# Altium footprint library Key & Switch's.PcbLib: 58 footprints (part 1 of 4)
Each footprint in its own frame and in the unit in brackets; x right, y up, seen from the top. Pads: shape width x height; smd on the part's side, far side on the other; paste and mask are expansions set on the pad; w line width, h text height; cw(c..) or ccw(c..) is an arc to the next point about the centre after c.
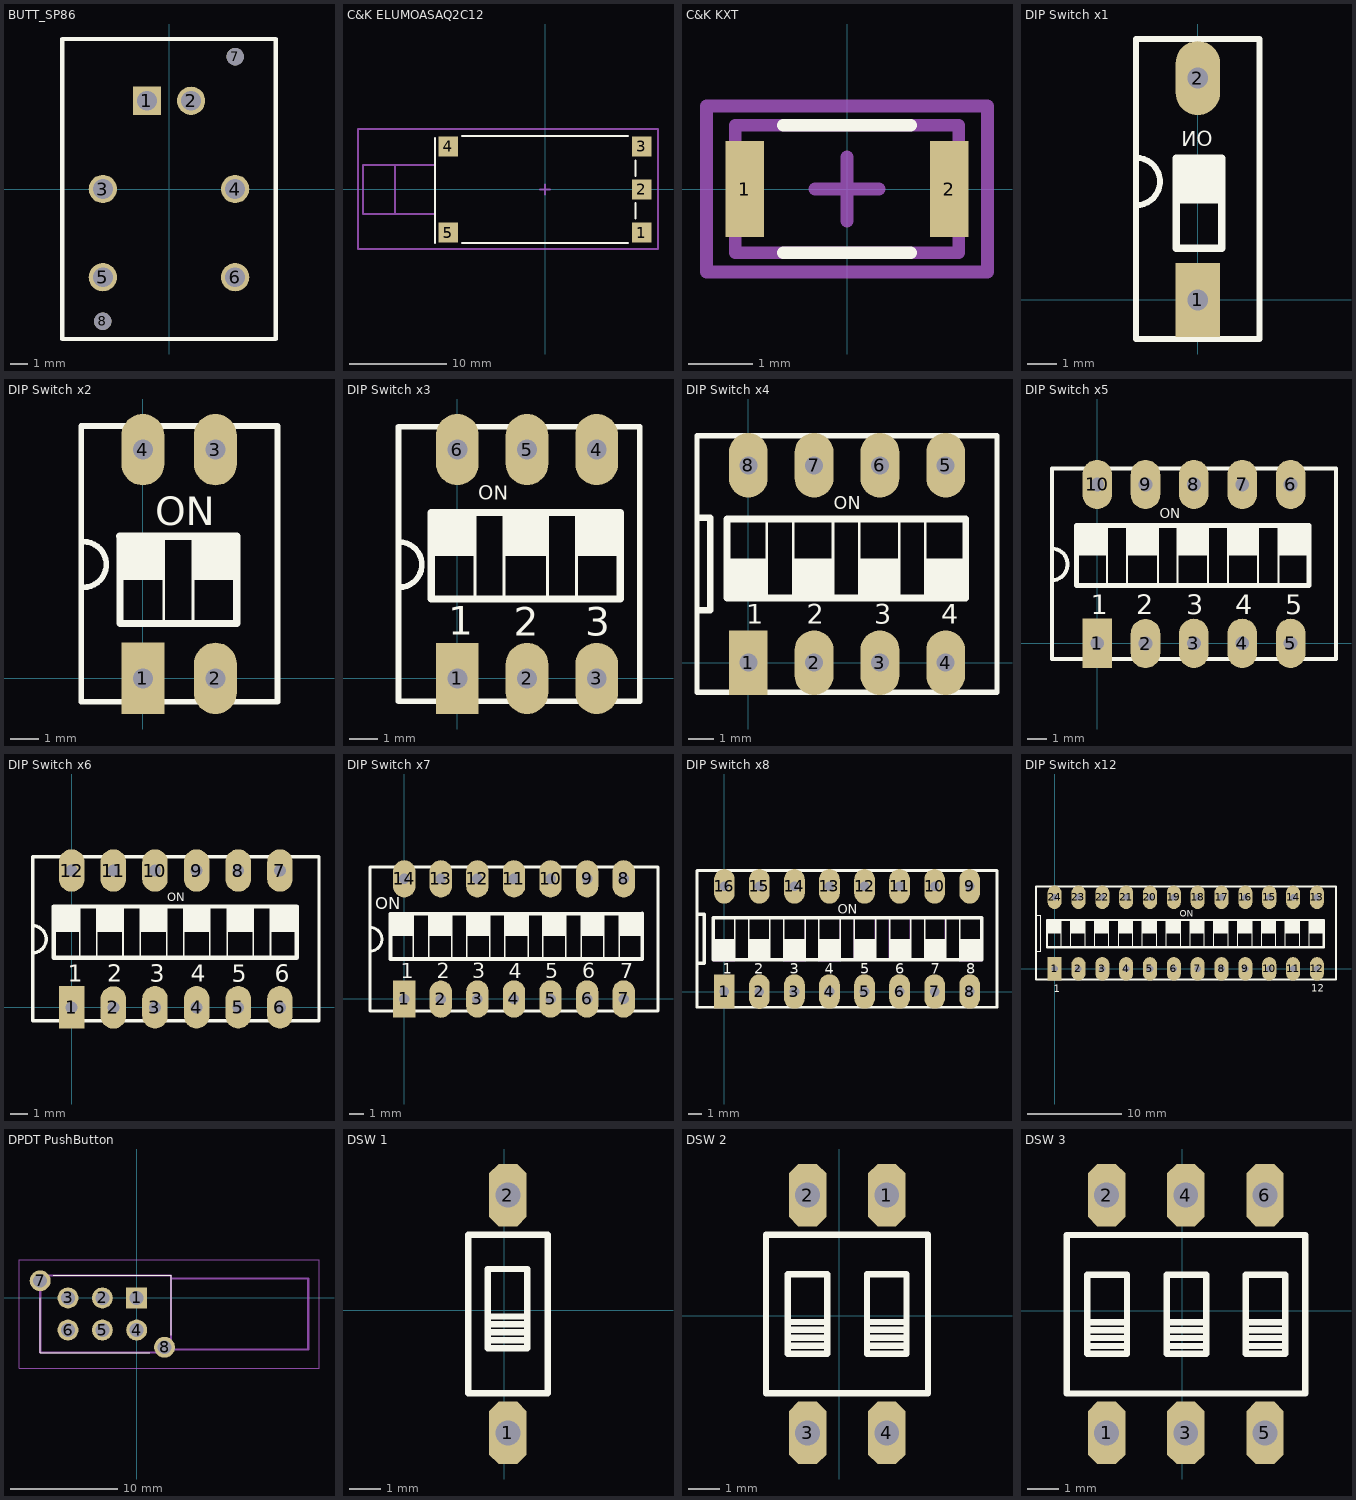
[diagram p0: the footprints below, top view; thin cyan lines are the x and y axes]

## BUTT_SP86 [mil]
pads (8):
  rect 64x64 hole 45: 1(-50,200)
  round 64 hole 45: 2(50,200) 3(-150,0) 4(150,0) 5(-150,-200) 6(150,-200)
  round 39.37 hole 39.37 unplated: 7(150,300) 8(-150.09,-299.86)
Top Overlay:
  lines w10: -242,-340 242,-340 242,340 -242,340 -242,-340
3D body "button86.stp": height 515.75, standoff -145.67, extent -344.49,-345 344.49,351.85

## C&K ELUMOASAQ2C12 [mm]
height 6.01
pads (5):
  rect 2.03x2.03 smd: 1(9.93,-4.42) 2(9.93,0) 3(9.93,4.42) 4(-9.93,4.42) 5(-9.93,-4.42)
Top Overlay:
  lines w0.2: -11.3,-5.5 -11.3,5.3 ; -8.5,-5.5 8.5,-5.5 ; -8.5,5.5 8.5,5.5 ; 9.3,-3 9.3,-1.4 ; 9.3,1.4 9.3,3
Mechanical 1:
  lines w0.2: -15.4,-2.5 -15.4,2.5 ; -11.3,-2.5 -18.7,-2.5 -18.7,2.5 -11.3,2.5
Mechanical 15:
  lines w0.2: -0.5,0 0.5,0 ; 0,-0.5 0,0.5 ; -19.2,-6.1 11.6,-6.1 11.6,6.2 -19.2,6.2 -19.2,-6.1
3D body "ELUMOASAQ2C12.STEP": height 5.59, standoff 0.25, extent -18.709,-5.715 10.415,5.715

## C&K KXT [mm]
height 0.6
pads (2):
  rect 0.6x1.5 smd: 1(-1.6,0) 2(1.6,0)
Top Overlay:
  lines w0.2: -1,-1 1,-1 ; -1,1 1,1
Mechanical 1:
  lines w0.2: -1.75,-1 1.75,-1 1.75,1 -1.75,1 -1.75,-1
Mechanical 15:
  lines w0.2: -0.5,0 0.5,0 ; 0,-0.5 0,0.5 ; -2.2,-1.3 2.2,-1.3 2.2,1.3 -2.2,1.3 -2.2,-1.3
3D body "C&K KXT.STEP": height 0.58, standoff 0, extent -1.75,-1 1.75,1

## DIP Switch x1 [mm]
height 6.5
pads (2):
  rect 1.5x2.5 hole 0.7: 1(0,0)
  oval 1.5x2.5 hole 0.7: 2(0,7.5)
Top Overlay:
  region: -0.746,4.79 -0.746,3.265 0.81,3.265 0.81,4.79
  lines w0.2: -2.08,3.202 ccw(c-2.08,4.002) -2.08,4.802 ; -2.09,-1.32 -2.09,8.82 2.08,8.82 2.08,-1.32 -2.09,-1.32
  lines w0.25: -0.73,1.74 -0.73,4.79
  lines w0.254: -0.73,1.74 0.81,1.74 0.81,4.79 -0.73,4.79
  text "ON" at 0.5,5.2 h0.5
3D body "User Library-dips sith 1.step": height 7.33, standoff -2.14, extent -1.94,-1.11 1.885,8.64

## DIP Switch x2 [mm]
height 6.5
pads (4):
  rect 1.5x2.5 hole 0.7: 1(0,0)
  oval 1.5x2.5 hole 0.7: 2(2.54,0) 3(2.54,8) 4(0,8)
Top Overlay:
  region: -0.816,4.97 -0.816,3.445 0.74,3.445 0.74,4.97
  region: 1.734,4.97 1.734,3.445 3.29,3.445 3.29,4.97
  lines w0.1: 0.73,1.92 0.73,4.94 ; 1.75,1.92 1.75,4.94
  lines w0.2: -2.08,3.182 ccw(c-2.08,3.982) -2.08,4.782 ; -2.16,-0.82 4.71,-0.82 4.71,8.83 -2.16,8.83 -2.16,-0.82
  lines w0.25: -0.8,1.92 -0.8,4.94
  lines w0.254: -0.816,4.97 3.29,4.97 3.29,1.92 -0.8,1.92
  text "ON" at 0.44,5.36 h1
3D body "dip2.STEP": height 6.91, standoff -1.79, extent -1.98,-1.03 4.52,8.97

## DIP Switch x3 [mm]
height 6.5
pads (6):
  rect 1.5x2.5 hole 0.7: 1(0,0)
  oval 1.5x2.5 hole 0.7: 2(2.45,0) 3(4.9,0) 4(4.9,8.05) 5(2.45,8.05) 6(0,8.05)
Top Overlay:
  region: -0.932,5.84 -0.932,4.315 0.624,4.315 0.624,5.84
  region: 1.624,5.84 1.624,4.315 3.18,4.315 3.18,5.84
  region: 4.174,5.84 4.174,4.315 5.73,4.315 5.73,5.84
  lines w0.1: 0.62,2.79 0.62,5.81 ; 1.64,2.79 1.64,5.81 ; 3.17,2.79 3.17,5.81 ; 4.19,2.79 4.19,5.81
  lines w0.2: -2.05,3.202 ccw(c-2.05,4.002) -2.05,4.802 ; -2.07,-0.8 6.41,-0.8 6.41,8.85 -2.07,8.85 -2.07,-0.8
  lines w0.25: -0.92,2.79 -0.92,5.81
  lines w0.254: -0.932,5.84 5.73,5.84 5.73,2.79 -0.92,2.79
  text "3" at 4.5,1.495 h1
  text "2" at 1.98,1.495 h1
  text "1" at -0.33,1.535 h1
  text "ON" at 0.74,6.28 h0.5
3D body "User Library-switch 3.step": height 7, standoff -3.7, extent -1.904,-0.81 6.23,9.09

## DIP Switch x4 [mm]
height 6.5
pads (8):
  rect 1.5x2.5 hole 0.7: 1(0,0)
  oval 1.5x2.5 hole 0.7: 2(2.54,0) 3(5.08,0) 4(7.62,0) 5(7.62,7.62) 6(5.08,7.62) 7(2.54,7.62) 8(0,7.62)
Top Overlay:
  region: 8.394,2.497 8.394,4.022 6.838,4.022 6.838,2.497
  region: 5.84,2.497 5.84,4.022 4.284,4.022 4.284,2.497
  region: 3.284,2.497 3.284,4.022 1.728,4.022 1.728,2.497
  region: 0.734,2.497 0.734,4.022 -0.822,4.022 -0.822,2.497
  lines w0.1: 0.718,2.527 0.718,5.547 ; 1.738,2.527 1.738,5.547 ; 3.268,2.527 3.268,5.547 ; 4.288,2.527 4.288,5.547 ; 5.828,2.527 5.828,5.547 ; 6.828,2.527 6.828,5.547
  lines w0.2: -1.981,-1.143 9.601,-1.143 9.601,8.763 -1.981,8.763 -1.981,-1.143
  lines w0.25: 8.388,5.547 8.394,2.497
  lines w0.254: -1.95,2.032 -1.473,2.032 -1.473,5.588 -1.95,5.588 ; 8.388,5.547 -0.822,5.547 -0.822,2.497 8.394,2.497
  text "4" at 7.444,1.495 h0.76
  text "3" at 4.853,1.495 h0.76
  text "2" at 2.261,1.495 h0.76
  text "1" at -0.076,1.495 h0.76
  text "ON" at 3.29,5.93 h0.5
Mechanical 1:
  circle w0.025: c0,0 r0.254
  circle w0.025: c2.54,-0.01 r0.254
  circle w0.025: c5.08,0 r0.254
  circle w0.025: c7.62,0 r0.254
  circle w0.025: c7.62,7.62 r0.254
  circle w0.025: c5.08,7.62 r0.254
  circle w0.025: c2.54,7.62 r0.254
  circle w0.025: c0,7.62 r0.254
3D body: height 6.35, standoff 0.25, extent -0.762,2.562 0.762,3.273
3D body: height 0.76, standoff 0, extent -0.253,7.367 0.253,7.873
3D body: height 0.76, standoff 0, extent 2.287,7.367 2.793,7.873
3D body: height 0.76, standoff 0, extent 4.827,7.367 5.333,7.873
3D body: height 0.76, standoff 0, extent 7.367,7.367 7.873,7.873
3D body: height 0.76, standoff 0, extent -0.253,-0.253 0.253,0.253
3D body: height 0.76, standoff 0, extent 2.287,-0.263 2.793,0.243
3D body: height 0.76, standoff 0, extent 4.827,-0.253 5.333,0.253
3D body: height 0.76, standoff 0, extent 7.367,-0.253 7.873,0.253
3D body: height 3.81, standoff 0, extent -1.981,1.9 -1.473,5.71
3D body: height 5.59, standoff 0, extent -1.981,-1.143 9.652,8.763
3D body: height 0.25, standoff 0.05, extent -1.981,-1.143 9.652,8.763
3D body: height 5.08, standoff 0.25, extent -0.762,3.273 0.762,5.453
3D body: height 5.08, standoff 0.25, extent 4.318,3.273 5.842,5.453
3D body: height 6.35, standoff 0.25, extent 4.318,2.562 5.842,3.273
3D body: height 5.08, standoff 0.25, extent 6.858,3.273 8.382,5.453
3D body: height 6.35, standoff 0.25, extent 6.858,2.562 8.382,3.273
3D body: height 5.59, standoff 0, extent -1.473,2.362 -0.762,5.253
3D body: height 5.59, standoff 0, extent 0.762,2.562 1.778,5.453
3D body: height 5.59, standoff 0, extent 5.842,2.562 6.858,5.453
3D body: height 5.59, standoff 0, extent 3.302,2.562 4.318,5.453
3D body: height 5.08, standoff 0.25, extent 1.778,3.273 3.302,5.453
3D body: height 6.35, standoff 0.25, extent 1.778,2.562 3.302,3.273
3D body: height 5.59, standoff 0.25, extent -1.021,5.975 0.597,7.55
3D body: height 5.59, standoff 0.03, extent -0.618,6.06 0.189,7.478
3D body: height 5.59, standoff 0.25, extent 0.734,5.986 2.3,7.537

## DIP Switch x5 [mm] "Switch DIP 5 way flat slide Thru-Hole-19624"
height 6.5
pads (10):
  rect 1.5x2.5 hole 0.7: 1(0,0)
  oval 1.5x2.5 hole 0.7: 2(2.45,-0.01) 3(4.9,0) 4(7.35,0) 5(9.8,0) 6(9.8,8.05) 7(7.35,8.05) 8(4.9,8.05) 9(2.45,8.05) 10(0,8.05)
Top Overlay:
  region: 9.164,5.97 9.164,4.445 10.72,4.445 10.72,5.97
  region: 6.614,5.97 6.614,4.445 8.17,4.445 8.17,5.97
  region: 4.058,5.97 4.058,4.445 5.614,4.445 5.614,5.97
  region: 1.504,5.97 1.504,4.445 3.06,4.445 3.06,5.97
  region: -1.046,5.97 -1.046,4.445 0.51,4.445 0.51,5.97
  lines w0.1: 0.5,2.92 0.5,5.94 ; 1.51,2.92 1.51,5.94 ; 3.07,2.92 3.07,5.94 ; 4.07,2.92 4.07,5.94 ; 5.61,2.92 5.61,5.94 ; 6.63,2.92 6.63,5.94 ; 8.16,2.92 8.16,5.94 ; 9.18,2.92 9.18,5.94
  lines w0.2: -2.3,3.202 ccw(c-2.3,4.002) -2.3,4.802 ; -2.3,-0.8 -2.3,8.85 12.1,8.85 12.1,-0.8 -2.3,-0.8
  lines w0.25: -1.04,2.92 -1.04,5.97
  lines w0.254: -1.04,2.92 10.72,2.92 10.72,5.97 -1.04,5.97
  text "ON" at 3.17,6.33 h0.5
  text "1" at -0.33,1.465 h1
  text "2" at 1.98,1.465 h1
  text "3" at 4.5,1.465 h1
  text "4" at 6.99,1.465 h1
  text "5" at 9.52,1.465 h1
3D body "User Library-Switch DIP 5 way flat slide Thru-Hole-19624.step": height 7.2, standoff -2, extent -2.22,-0.93 12.04,8.97

## DIP Switch x6 [mm]
height 6.5
pads (12):
  rect 1.5x2.5 hole 0.7: 1(0,0)
  oval 1.5x2.5 hole 0.7: 2(2.45,-0.01) 3(4.9,0) 4(7.35,0) 5(9.8,0) 6(12.25,0) 7(12.25,8.05) 8(9.8,8.05) 9(7.35,8.05) 10(4.9,8.05) 11(2.45,8.05) 12(0,8.05)
Top Overlay:
  region: -1.076,5.96 -1.076,4.435 0.48,4.435 0.48,5.96
  region: 1.474,5.96 1.474,4.435 3.03,4.435 3.03,5.96
  region: 4.024,5.96 4.024,4.435 5.58,4.435 5.58,5.96
  region: 6.578,5.96 6.578,4.435 8.134,4.435 8.134,5.96
  region: 9.134,5.96 9.134,4.435 10.69,4.435 10.69,5.96
  region: 11.684,5.96 11.684,4.435 13.24,4.435 13.24,5.96
  lines w0.1: 0.47,2.91 0.47,5.93 ; 1.48,2.91 1.48,5.93 ; 3.02,2.91 3.02,5.93 ; 4.03,2.91 4.03,5.93 ; 5.59,2.91 5.59,5.93 ; 6.59,2.91 6.59,5.93 ; 8.13,2.91 8.13,5.93 ; 9.15,2.91 9.15,5.93 ; 10.68,2.91 10.68,5.93 ; 11.7,2.91 11.7,5.93
  lines w0.2: -2.3,3.202 ccw(c-2.3,4.002) -2.3,4.802 ; -2.3,-0.8 14.55,-0.8 14.55,8.85 -2.3,8.85 -2.3,-0.8
  lines w0.25: -1.06,2.91 -1.06,5.93
  lines w0.254: -1.06,2.91 13.24,2.91 13.24,5.93 -1.06,5.93
  text "6" at 11.94,1.495 h1
  text "5" at 9.42,1.495 h1
  text "4" at 6.99,1.495 h1
  text "3" at 4.6,1.495 h1
  text "2" at 2.08,1.495 h1
  text "1" at -0.23,1.495 h1
  text "ON" at 5.63,6.23 h0.5
3D body "User Library-106S.STEP": height 6.43, standoff -2.42, extent -2.19,-0.82 14.51,8.88

## DIP Switch x7 [mm]
height 6.5
pads (14):
  rect 1.5x2.5 hole 0.7: 1(0,0)
  oval 1.5x2.5 hole 0.7: 2(2.45,-0.01) 3(4.9,0) 4(7.35,0) 5(9.8,0) 6(12.25,0) 7(14.7,0) 8(14.7,8.05) 9(12.25,8.05) 10(9.8,8.05) 11(7.35,8.05) 12(4.9,8.05) 13(2.45,8.05) 14(0,8.05)
Top Overlay:
  region: 14.384,5.73 14.384,4.205 15.94,4.205 15.94,5.73
  region: 11.834,5.73 11.834,4.205 13.39,4.205 13.39,5.73
  region: 9.278,5.73 9.278,4.205 10.834,4.205 10.834,5.73
  region: 6.724,5.73 6.724,4.205 8.28,4.205 8.28,5.73
  region: 4.174,5.73 4.174,4.205 5.73,4.205 5.73,5.73
  region: 1.624,5.73 1.624,4.205 3.18,4.205 3.18,5.73
  region: -0.936,5.73 -0.936,4.205 0.62,4.205 0.62,5.73
  lines w0.1: 0.61,2.68 0.61,5.7 ; 1.64,2.68 1.64,5.7 ; 3.17,2.68 3.17,5.7 ; 4.18,2.68 4.18,5.7 ; 5.72,2.68 5.72,5.7 ; 6.73,2.68 6.73,5.7 ; 8.29,2.68 8.29,5.7 ; 9.29,2.68 9.29,5.7 ; 10.83,2.68 10.83,5.7 ; 11.85,2.68 11.85,5.7 ; 13.38,2.68 13.38,5.7 ; 14.4,2.68 14.4,5.7
  lines w0.2: -2.3,3.202 ccw(c-2.3,4.002) -2.3,4.802 ; -2.3,-0.8 -2.3,8.85 17,8.85 17,-0.8 -2.3,-0.8
  lines w0.25: -0.92,2.68 -0.92,5.7
  lines w0.254: -0.92,2.68 15.94,2.68 15.94,5.73 -0.92,5.7
  text "ON" at -1.93,6.02 h0.8
  text "1" at -0.23,1.395 h1
  text "2" at 2.16,1.395 h1
  text "3" at 4.57,1.395 h1
  text "4" at 6.99,1.395 h1
  text "5" at 9.43,1.395 h1
  text "6" at 11.94,1.395 h1
  text "7" at 14.47,1.395 h1
3D body "User Library-DIPSWITCH7.step": height 7, standoff -3.1, extent -2.29,-1 16.85,9.16

## DIP Switch x8 [mm]
height 6.5
pads (16):
  rect 1.5x2.5 hole 0.7: 1(0,0)
  oval 1.5x2.5 hole 0.7: 2(2.54,-0.01) 3(5.08,0) 4(7.62,0) 5(10.16,0) 6(12.7,0) 7(15.24,0) 8(17.78,0) 9(17.78,7.62) 10(15.24,7.62) 11(12.7,7.62) 12(10.16,7.62) 13(7.62,7.62) 14(5.08,7.62) 15(2.54,7.62) 16(0,7.62)
Top Overlay:
  region: 18.629,2.297 18.629,3.822 17.073,3.822 17.073,2.297
  region: 16.079,2.297 16.079,3.822 14.523,3.822 14.523,2.297
  region: 13.519,2.297 13.519,3.822 11.963,3.822 11.963,2.297
  region: 10.969,2.297 10.969,3.822 9.413,3.822 9.413,2.297
  region: 8.419,2.297 8.419,3.822 6.863,3.822 6.863,2.297
  region: 5.866,2.297 5.866,3.822 4.309,3.822 4.309,2.297
  region: 3.309,2.297 3.309,3.822 1.753,3.822 1.753,2.297
  region: 0.759,2.297 0.759,3.822 -0.797,3.822 -0.797,2.297
  lines w0.1: 0.743,2.327 0.743,5.347 ; 1.763,2.327 1.763,5.347 ; 3.293,2.327 3.293,5.347 ; 4.313,2.327 4.313,5.347 ; 5.853,2.327 5.853,5.347 ; 6.853,2.327 6.853,5.347 ; 8.413,2.327 8.413,5.347 ; 9.423,2.327 9.423,5.347 ; 10.963,2.327 10.963,5.347 ; 11.973,2.327 11.973,5.347 ; 13.503,2.327 13.503,5.347 ; 14.533,2.327 14.533,5.347 ; 16.063,2.327 16.063,5.347 ; 17.073,2.327 17.073,5.347
  lines w0.2: -1.981,-1.143 19.761,-1.143 19.761,8.763 -1.981,8.763 -1.981,-1.143
  lines w0.254: -1.94,2.032 -1.473,2.032 -1.473,5.588 -1.93,5.588 ; -0.797,2.297 -0.797,5.347 18.653,5.347 18.653,2.297 -0.797,2.297
  text "8" at 17.526,1.295 h0.76
  text "7" at 14.965,1.295 h0.76
  text "6" at 12.405,1.295 h0.76
  text "5" at 9.844,1.295 h0.76
  text "4" at 7.284,1.295 h0.76
  text "3" at 4.723,1.295 h0.76
  text "2" at 2.163,1.295 h0.76
  text "1" at -0.101,1.295 h0.76
  text "ON" at 8.23,5.65 h0.7
Mechanical 1:
  circle w0.025: c17.78,0 r0.254
  circle w0.025: c17.78,7.62 r0.254
  circle w0.025: c15.24,7.62 r0.254
  circle w0.025: c15.24,0 r0.254
  circle w0.025: c12.7,0 r0.254
  circle w0.025: c12.7,7.62 r0.254
  circle w0.025: c10.16,7.62 r0.254
  circle w0.025: c10.16,0 r0.254
  circle w0.025: c7.62,0 r0.254
  circle w0.025: c7.62,7.62 r0.254
  circle w0.025: c5.08,7.62 r0.254
  circle w0.025: c5.08,0 r0.254
  circle w0.025: c2.54,-0.01 r0.254
  circle w0.025: c2.54,7.62 r0.254
  circle w0.025: c0,7.62 r0.254
  circle w0.025: c0,0 r0.254
  lines w0.025: 0.762,5.334 0.762,5.41 -0.813,5.41 -0.813,2.235 0.762,2.235 0.762,5.359 ; 4.318,5.334 5.867,5.334 5.867,2.235 4.318,2.235 4.318,5.359 ; 6.833,5.309 8.407,5.309 8.407,2.235 6.833,2.235 6.833,5.359 ; 9.423,5.359 10.947,5.359 10.947,2.261 9.423,2.261 9.423,5.385 ; 11.938,5.309 13.487,5.309 13.487,2.261 11.938,2.261 11.938,5.359 ; 14.529,5.334 14.529,2.261 16.027,2.261 16.027,5.359 14.529,5.359 ; 17.069,5.334 18.694,5.334 18.694,2.235 17.069,2.235 17.069,5.359 ; -1.981,-1.143 -1.981,8.763 19.761,8.763 19.761,-1.143 -1.981,-1.143 ; -1.981,2.032 -1.473,2.032 -1.473,5.588 -1.981,5.588 -1.981,2.032 ; 1.778,2.261 1.778,5.334 3.302,5.334 3.302,2.261 1.778,2.261
3D body: height 0.76, standoff 0, extent 9.867,7.337 10.373,7.843
3D body: height 6.35, standoff 0, extent 17.069,2.235 18.693,3.759
3D body: height 6.35, standoff 0, extent 14.529,2.236 16.154,3.76
3D body: height 6.35, standoff 0, extent 11.938,2.261 13.563,3.785
3D body: height 6.35, standoff 0, extent 9.423,2.262 11.048,3.786
3D body: height 6.35, standoff 0, extent 6.833,2.236 8.457,3.76
3D body: height 6.35, standoff 0, extent 4.318,2.236 5.943,3.76
3D body: height 6.35, standoff 0, extent 1.778,2.261 3.403,3.785
3D body: height 6.35, standoff 0, extent -0.813,2.235 0.812,3.759
3D body: height 5.08, standoff 0, extent -0.813,2.312 0.812,5.41
3D body: height 5.08, standoff 0, extent 1.778,2.312 3.403,5.41
3D body: height 5.08, standoff 0, extent 9.423,2.262 11.048,5.359
3D body: height 5.08, standoff 0, extent 11.938,2.339 13.563,5.437
3D body: height 5.08, standoff 0, extent 14.529,2.338 16.153,5.436
3D body: height 0.76, standoff 0, extent 17.527,-0.253 18.033,0.253
3D body: height 0.76, standoff 0, extent 14.987,-0.253 15.493,0.253
3D body: height 0.76, standoff 0, extent 12.447,-0.253 12.953,0.253
3D body: height 0.76, standoff 0, extent 9.907,-0.253 10.413,0.253
3D body: height 5.08, standoff 0, extent 17.069,2.313 18.693,5.411
3D body: height 5.08, standoff 0, extent 14.528,2.26 16.028,5.36
3D body: height 5.08, standoff 0, extent 6.832,2.339 8.405,5.411
3D body: height 0.76, standoff 0, extent 7.367,-0.253 7.873,0.253
3D body: height 0.76, standoff 0, extent 4.827,-0.253 5.333,0.253
3D body: height 0.76, standoff 0, extent 2.287,-0.263 2.793,0.243
3D body: height 0.76, standoff 0, extent -0.253,-0.253 0.253,0.253
3D body: height 5.08, standoff 0, extent 4.318,2.236 5.866,5.334
3D body: height 0.76, standoff 0, extent 14.987,7.367 15.493,7.873
3D body: height 0.76, standoff 0, extent 12.447,7.367 12.953,7.873
3D body: height 0.76, standoff 0, extent 17.527,7.367 18.033,7.873
3D body: height 0.76, standoff 0, extent -0.253,7.367 0.253,7.873
3D body: height 0.76, standoff 0, extent 7.367,7.367 7.873,7.873
3D body: height 0.76, standoff 0, extent 4.827,7.367 5.333,7.873
3D body: height 0.76, standoff 0, extent 2.287,7.367 2.793,7.873
3D body: height 3.81, standoff 0, extent -1.981,2.032 -1.473,5.613
3D body: height 5.59, standoff 0, extent -1.981,-1.143 19.761,2.236
3D body: height 5.59, standoff 0, extent -1.981,5.41 19.761,8.763
3D body: height 5.59, standoff 0, extent -1.473,2.235 -0.813,5.41
3D body: height 5.59, standoff 0, extent 0.762,2.235 1.778,5.41
3D body: height 5.59, standoff 0, extent 3.403,2.236 4.318,5.411
3D body: height 5.59, standoff 0, extent 5.866,2.236 6.832,5.411
3D body: height 5.59, standoff 0, extent 8.407,2.236 9.423,5.411
3D body: height 5.59, standoff 0, extent 11.048,2.262 11.938,5.437
3D body: height 5.59, standoff 0, extent 13.487,2.261 14.529,5.436
3D body: height 5.59, standoff 0, extent 16.154,2.236 17.069,5.411
3D body: height 5.59, standoff 0, extent 18.693,2.235 19.761,5.41
3D body: height 5.59, standoff 0.25, extent -0.796,5.735 0.822,7.309
3D body: height 5.59, standoff 0.03, extent -0.394,5.82 0.414,7.237
3D body: height 5.59, standoff 0.25, extent 0.959,5.745 2.525,7.297

## DIP Switch x12 [mm]
pads (24):
  rect 1.5x2.5 hole 0.7: 1(0,0)
  oval 1.5x2.5 hole 0.7: 2(2.54,0) 3(5.08,0) 4(7.62,0) 5(10.16,0) 6(12.7,0) 7(15.24,0) 8(17.78,0) 9(20.32,0) 10(22.86,0) 11(25.4,0) 12(27.94,0) 13(27.94,7.62) 14(25.4,7.62) 15(22.86,7.62) 16(20.32,7.62) 17(17.78,7.62) 18(15.24,7.62) 19(12.7,7.62) 20(10.16,7.62) 21(7.62,7.62) 22(5.08,7.62) 23(2.54,7.62) 24(0,7.62)
Top Overlay:
  region: 0.712,3.752 0.712,5.198 -0.812,5.198 -0.812,3.752
  region: 3.252,3.752 3.252,5.198 1.728,5.198 1.728,3.752
  region: 5.792,3.752 5.792,5.198 4.268,5.198 4.268,3.752
  region: 8.332,3.752 8.332,5.198 6.808,5.198 6.808,3.752
  region: 10.872,3.752 10.872,5.198 9.348,5.198 9.348,3.752
  region: 13.412,3.752 13.412,5.198 11.888,5.198 11.888,3.752
  region: 15.952,3.752 15.952,5.198 14.428,5.198 14.428,3.752
  region: 18.492,3.752 18.492,5.198 16.968,5.198 16.968,3.752
  region: 21.032,3.752 21.032,5.198 19.508,5.198 19.508,3.752
  region: 23.572,3.752 23.572,5.198 22.048,5.198 22.048,3.752
  region: 26.112,3.752 26.112,5.198 24.588,5.198 24.588,3.752
  region: 28.652,3.752 28.652,5.198 27.128,5.198 27.128,3.752
  lines w0.1: -0.812,2.307 -0.812,5.198 ; 0.712,2.307 0.712,5.198 ; 1.728,2.307 1.728,5.198 ; 3.252,2.307 3.252,5.198 ; 4.268,2.307 4.268,5.198 ; 5.792,2.307 5.792,5.198 ; 6.808,2.307 6.808,5.198 ; 8.332,2.307 8.332,5.198 ; 9.348,2.307 9.348,5.198 ; 10.872,2.307 10.872,5.198 ; 11.888,2.307 11.888,5.198 ; 13.412,2.307 13.412,5.198 ; 14.428,2.307 14.428,5.198 ; 15.952,2.307 15.952,5.198 ; 16.968,2.307 16.968,5.198 ; 18.492,2.307 18.492,5.198 ; 19.508,2.307 19.508,5.198 ; 21.032,2.307 21.032,5.198 ; 22.048,2.307 22.048,5.198 ; 23.572,2.307 23.572,5.198 ; 24.588,2.307 24.588,5.198 ; 26.112,2.307 26.112,5.198 ; 27.128,2.307 27.128,5.198
  lines w0.127: -1.981,1.9 -1.473,1.9 -1.473,5.71 -1.981,5.71
  lines w0.2: -1.981,-1.143 29.972,-1.143 29.972,8.763 -1.981,8.763 -1.981,-1.143
  lines w0.254: -0.812,2.307 -0.812,5.198 28.652,5.198 28.652,2.307 -0.812,2.307
  text "1" at -0.08,-2.51 h0.76
  text "12" at 27.36,-2.43 h0.76
  text "ON" at 13.34,5.55 h0.7
Mechanical 1:
  circle w0.025: c0,7.62 r0.254
  circle w0.025: c2.54,7.62 r0.254
  circle w0.025: c5.08,7.62 r0.254
  circle w0.025: c7.62,7.62 r0.254
  circle w0.025: c7.62,0 r0.254
  circle w0.025: c5.08,0 r0.254
  circle w0.025: c2.54,-0.01 r0.254
  circle w0.025: c0,0 r0.254
  circle w0.025: c10.16,0 r0.254
  circle w0.025: c10.16,7.62 r0.254
  circle w0.025: c12.7,7.62 r0.254
  circle w0.025: c12.7,0 r0.254
  circle w0.025: c15.24,0 r0.254
  circle w0.025: c17.78,7.62 r0.254
  circle w0.025: c17.78,0 r0.254
3D body: height 5.59, standoff 0, extent 0.712,2.307 1.728,5.198
3D body: height 5.08, standoff 0.25, extent -0.812,2.307 0.712,4.487
3D body: height 6.35, standoff 0.25, extent -0.812,4.487 0.712,5.198
3D body: height 5.59, standoff 0, extent 3.252,2.307 4.268,5.198
3D body: height 5.08, standoff 0.25, extent 1.728,2.307 3.252,4.487
3D body: height 6.35, standoff 0.25, extent 1.728,4.487 3.252,5.198
3D body: height 5.59, standoff 0, extent 5.792,2.307 6.808,5.198
3D body: height 5.08, standoff 0.25, extent 4.268,2.307 5.792,4.487
3D body: height 6.35, standoff 0.25, extent 4.268,4.487 5.792,5.198
3D body: height 5.59, standoff 0, extent 8.332,2.307 9.348,5.198
3D body: height 5.08, standoff 0.25, extent 6.808,2.307 8.332,4.487
3D body: height 6.35, standoff 0.25, extent 6.808,4.487 8.332,5.198
3D body: height 5.59, standoff 0, extent 10.872,2.307 11.888,5.198
3D body: height 5.08, standoff 0.25, extent 9.348,2.307 10.872,4.487
3D body: height 6.35, standoff 0.25, extent 9.348,4.487 10.872,5.198
3D body: height 5.59, standoff 0, extent 13.412,2.307 14.428,5.198
3D body: height 5.08, standoff 0.25, extent 11.888,2.307 13.412,4.487
3D body: height 6.35, standoff 0.25, extent 11.888,4.487 13.412,5.198
3D body: height 5.59, standoff 0, extent 15.952,2.307 16.968,5.198
3D body: height 5.08, standoff 0.25, extent 14.428,2.307 15.952,4.487
3D body: height 6.35, standoff 0.25, extent 14.428,4.487 15.952,5.198
3D body: height 5.59, standoff 0, extent 18.492,2.307 19.508,5.198
3D body: height 5.08, standoff 0.25, extent 16.968,2.307 18.492,4.487
3D body: height 6.35, standoff 0.25, extent 16.968,4.487 18.492,5.198
3D body: height 6.35, standoff 0.25, extent 24.588,4.487 26.112,5.198
3D body: height 5.08, standoff 0.25, extent 24.588,2.307 26.112,4.487
3D body: height 5.59, standoff 0, extent 23.572,2.307 24.588,5.198
3D body: height 5.59, standoff 0, extent 21.032,2.307 22.048,5.198
3D body: height 5.59, standoff 0, extent 26.112,2.307 27.128,5.198
3D body: height 5.59, standoff 0, extent -1.473,2.362 -0.762,5.253
3D body: height 6.35, standoff 0.25, extent 19.508,4.487 21.032,5.198
3D body: height 5.08, standoff 0.25, extent 19.508,2.307 21.032,4.487
3D body: height 6.35, standoff 0.25, extent 22.048,4.487 23.572,5.198
3D body: height 5.08, standoff 0.25, extent 22.048,2.307 23.572,4.487
3D body: height 5.08, standoff 0.25, extent 27.128,2.307 28.652,4.487
3D body: height 0.25, standoff 0.05, extent -1.981,-1.143 29.972,8.763
3D body: height 5.59, standoff 0, extent -1.981,-1.143 29.972,8.763
3D body: height 3.81, standoff 0, extent -1.981,1.9 -1.473,5.71
3D body: height 0.76, standoff 0, extent 7.367,-0.253 7.873,0.253
3D body: height 0.76, standoff 0, extent 4.827,-0.253 5.333,0.253
3D body: height 0.76, standoff 0, extent 2.287,-0.263 2.793,0.243
3D body: height 0.76, standoff 0, extent -0.253,-0.253 0.253,0.253
3D body: height 0.76, standoff 0, extent 7.367,7.367 7.873,7.873
3D body: height 0.76, standoff 0, extent 4.827,7.367 5.333,7.873
3D body: height 0.76, standoff 0, extent 2.287,7.367 2.793,7.873
3D body: height 0.76, standoff 0, extent -0.253,7.367 0.253,7.873
3D body: height 6.35, standoff 0.25, extent 27.128,4.487 28.652,5.198
3D body: height 0.76, standoff 0, extent 14.987,7.367 15.493,7.873
3D body: height 0.76, standoff 0, extent 17.527,7.367 18.033,7.873
3D body: height 0.76, standoff 0, extent 12.447,7.367 12.953,7.873
3D body: height 0.76, standoff 0, extent 9.907,-0.253 10.413,0.253
3D body: height 0.76, standoff 0, extent 12.447,-0.253 12.953,0.253
3D body: height 0.76, standoff 0, extent 14.987,-0.253 15.493,0.253
3D body: height 0.76, standoff 0, extent 17.527,-0.253 18.033,0.253
3D body: height 0.76, standoff 0, extent 20.067,-0.253 20.573,0.253
3D body: height 0.76, standoff 0, extent 22.607,-0.253 23.113,0.253
3D body: height 0.76, standoff 0, extent 25.147,-0.253 25.653,0.253
3D body: height 0.76, standoff 0, extent 27.687,-0.253 28.193,0.253
3D body: height 0.76, standoff 0, extent 27.687,7.367 28.193,7.873
3D body: height 0.76, standoff 0, extent 25.147,7.367 25.653,7.873
3D body: height 0.76, standoff 0, extent 22.607,7.367 23.113,7.873
3D body: height 0.76, standoff 0, extent 20.067,7.367 20.573,7.873
3D body: height 5.59, standoff 0.25, extent 0.799,6.015 2.365,7.567
3D body: height 5.59, standoff 0.03, extent -0.554,6.09 0.254,7.507
3D body: height 5.59, standoff 0.25, extent -0.956,6.005 0.662,7.579

## DPDT PushButton [mm]
pads (8):
  rect 1.95x1.95 hole 1.3: 1(0,0)
  round 1.95 hole 1.3: 2(-3.2,0) 3(-6.4,0) 4(0,-3) 5(-3.2,-3) 6(-6.4,-3) 7(-9,1.6) 8(2.6,-4.6)
Top Overlay:
  lines w0.1: -9,0 -9,-5.1 1.2,-5.1 ; -7.8,2.1 3.2,2.1 3.2,-3.5
Mechanical 13:
  lines w0.2: 3.2,-4.8 16,-4.8 16,1.8 3.2,1.8 ; -9,-5.1 -9,2.1 3.2,2.1 3.2,-5.1 -9,-5.1
Mechanical 15:
  lines w0.1: -10.975,-6.575 -10.975,3.575 17,3.575 17,-6.575 -10.975,-6.575

## DSW 1 [mm]
pads (2):
  oct 1.2x2 hole 0.8: 1(0.12,-3.935) 2(0.12,3.685)
Top Overlay:
  lines w0.203: -0.527,-0.967 0.743,-0.967 ; -0.527,-0.713 0.743,-0.713 ; -0.527,-0.459 0.743,-0.459 ; -0.527,-0.205 0.743,-0.205 ; -1.15,-2.665 -1.15,2.415 1.395,2.415 1.395,-2.665 -1.15,-2.665 ; -0.527,-1.221 0.743,-1.221 0.743,1.319 -0.527,1.319 -0.527,-1.221
3D body "User Library-DIP-16-SW.STEP": height 7.4, standoff -3.35, extent -1.168,-5.077 1.372,4.823

## DSW 2 [mm]
pads (4):
  oct 1.2x2 hole 0.8: 1(1.525,3.868) 2(-1.015,3.868) 3(-1.015,-3.752) 4(1.525,-3.752)
Top Overlay:
  lines w0.203: -1.65,-0.958 -0.38,-0.958 ; -1.65,-0.704 -0.38,-0.704 ; -1.65,-0.45 -0.38,-0.45 ; -1.65,-0.196 -0.38,-0.196 ; 0.89,-0.958 2.16,-0.958 ; 0.89,-0.704 2.16,-0.704 ; 0.89,-0.45 2.16,-0.45 ; 0.89,-0.196 2.16,-0.196 ; -2.35,-2.482 2.85,-2.482 2.85,2.598 -2.35,2.598 -2.35,-2.482 ; -1.65,-1.212 -0.38,-1.212 -0.38,1.328 -1.65,1.328 -1.65,-1.212 ; 0.89,-1.212 2.16,-1.212 2.16,1.328 0.89,1.328 0.89,-1.212
3D body "User Library-DIP-16-SW.STEP": height 7.4, standoff -3.35, extent 0.2,-4.875 2.74,5.025
3D body "User Library-DIP-16-SW.STEP": height 7.4, standoff -3.35, extent -2.34,-4.875 0.2,5.025

## DSW 3 [mm]
pads (6):
  oct 1.2x2 hole 0.8: 1(-2.425,-3.918) 2(-2.425,3.702) 3(0.115,-3.918) 4(0.115,3.702) 5(2.655,-3.918) 6(2.655,3.702)
Top Overlay:
  lines w0.203: -3.04,-1.133 -1.77,-1.133 ; -3.04,-0.879 -1.77,-0.879 ; -3.04,-0.625 -1.77,-0.625 ; -3.04,-0.371 -1.77,-0.371 ; -0.5,-1.133 0.77,-1.133 ; -0.5,-0.879 0.77,-0.879 ; -0.5,-0.625 0.77,-0.625 ; -0.5,-0.371 0.77,-0.371 ; 2.04,-1.133 3.31,-1.133 ; 2.04,-0.879 3.31,-0.879 ; 2.04,-0.625 3.31,-0.625 ; 2.04,-0.371 3.31,-0.371 ; -3.7,-2.657 -3.7,2.423 3.945,2.423 3.945,-2.657 -3.7,-2.657 ; -3.04,-1.387 -3.04,1.153 -1.77,1.153 -1.77,-1.387 -3.04,-1.387 ; -0.5,-1.387 -0.5,1.153 0.77,1.153 0.77,-1.387 -0.5,-1.387 ; 2.04,-1.387 2.04,1.153 3.31,1.153 3.31,-1.387 2.04,-1.387
3D body "User Library-DIP-16-SW.STEP": height 7.4, standoff -3.35, extent 1.415,-5.075 3.955,4.825
3D body "User Library-DIP-16-SW.STEP": height 7.4, standoff -3.35, extent -3.665,-5.075 -1.125,4.825
3D body "User Library-DIP-16-SW.STEP": height 7.4, standoff -3.35, extent -1.125,-5.075 1.415,4.825